# Altium footprint library nhan.PcbLib: 11 footprints
Each footprint in its own frame and in the unit in brackets; x right, y up, seen from the top. Pads: shape width x height; smd on the part's side, far side on the other; paste and mask are expansions set on the pad; w line width, h text height; cw(c..) or ccw(c..) is an arc to the next point about the centre after c.
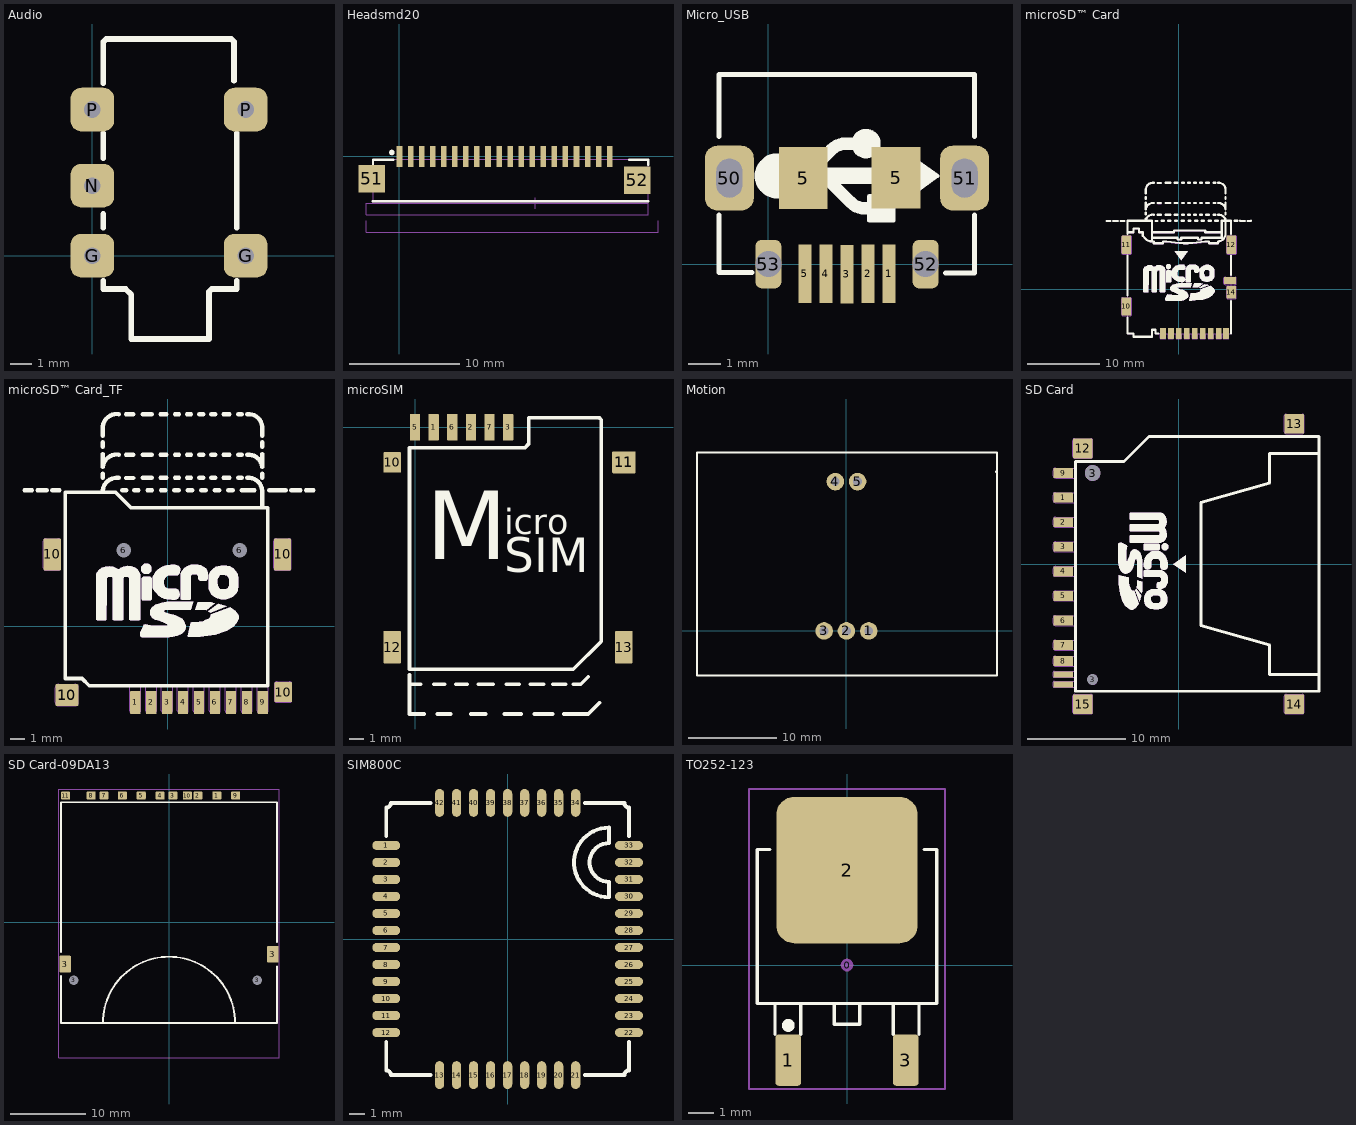
[diagram p0: the footprints below, top view; thin cyan lines are the x and y axes]

## Audio [mm]
pads (5):
  rrect50% 2x2 hole 0.762 square: G(0,0) G(7.01,0) N(0,3.2) P(0,6.68) P(7.01,6.68)
Top Overlay:
  lines w0.254: 0.508,-1.143 0.508,-1.524 1.524,-1.524 1.778,-1.778 1.778,-3.81 5.334,-3.81 5.334,-1.651 5.461,-1.524 6.604,-1.524 6.604,-1.143 ; 0.508,1.27 0.508,1.905 ; 0.508,4.445 0.508,5.588 ; 0.508,7.874 0.508,8.89 0.508,9.652 0.508,9.779 0.635,9.906 6.35,9.906 6.477,9.779 6.477,8.001 ; 6.604,1.27 6.604,5.588
3D body "User Library-minijack.STEP": height 5.01, standoff -1.99, extent 0.858,-3.952 6.858,10.048

## Headsmd20 [mm] "Headsmd20-1mmpich"
pads (22):
  rect 0.5x1.9 smd: 1(0,0) 2(1,0) 3(2,0) 4(3,0) 5(4,0) 6(5,0) 7(6,0) 8(7,0) 9(8,0) 10(9,0) 11(10,0) 12(11,0) 13(12,0) 14(13,0) 15(14,0) 16(15,0) 17(16,0) 18(17,0) 19(18,0) 20(19,0)
  rect 2.4x2.5 smd: 51(-2.5,-2.032) 52(21.5,-2.159)
Top Overlay:
  circle w0.25: c-0.692,0.35 r0.125
  lines w0.2: -2.413,-4.064 22.479,-4.064 ; -2.392,-1.1 -2.392,-0.3 -0.542,-0.3 ; 20.74,-0.3 22.479,-0.3 22.479,-0.762
Mechanical 13:
  lines w0.1: -2.992,-5.8 -2.992,-6.85 23.368,-6.85 23.368,-5.8 ; -2.992,-5.3 22.479,-5.3 22.479,-4.25 -2.992,-4.25 -2.992,-5.3 ; -2.392,-4.191 -2.392,-0.254 22.479,-0.254 22.479,-4.191 -2.392,-4.191
Mechanical 15:
  lines w0.1: 11.758,-4.25 12.758,-4.25 ; 12.258,-4.75 12.258,-3.75
3D body: height 2, standoff 0, extent -2.33,-3.568 22.479,0.381
3D body: height 2, standoff 0, extent -2.991,-5.299 22.479,-4.251

## Micro_USB [mm]
pads (11):
  rect 0.4x1.8 smd: 1(3.725,-0.3) 2(3.075,-0.3) 3(2.425,-0.311) 4(1.775,-0.3) 5(1.125,-0.3)
  rect 1.5x1.9 smd: 5(1.071,2.653) 5(3.937,2.667)
  rrect50% 1.5x2 hole 0.8 slot 1.2 at 90 deg: 50(-1.2,2.65) 51(6.05,2.65)
  rrect50% 0.8x1.5 hole 0.8: 52(4.85,0) 53(0,0)
Top Overlay:
  circle w0.508: c3.011,3.714 r0.2
  circle w0.889: c0.277,2.718 r0.254
  region: 3.862,1.343 3.111,1.343 3.111,2.093 3.862,2.093
  region: 5.212,2.718 4.512,2.218 4.512,3.218
  lines w0.127: 3.111,1.343 3.862,1.343 3.862,2.093 3.111,2.093 3.111,1.343 ; 4.512,2.218 4.512,3.218 5.212,2.718 4.512,2.218
  lines w0.152: -1.524,1.519 -1.524,-0.254 -0.508,-0.254 ; -1.524,3.933 -1.524,5.842 6.35,5.842 6.35,3.933 ; 5.461,-0.279 6.35,-0.279 6.35,1.519
  lines w0.381: 1.071,2.653 1.944,3.526 cw(c2.397,3.073) 2.397,3.714 2.984,3.714 ; 1.786,2.655 2.536,1.905 ccw(c2.988,2.358) 2.988,1.718 3.492,1.718
  lines w0.508: 0.318,2.718 4.763,2.718
3D body "User Library-ZX62D-AB-5P8.STEP": height 2.75, standoff -0.64, extent -2.039,-0.054 6.611,5.845

## microSD™ Card [mm] "CONN MICRO SD CARD PUSH-PUSH R/A"
height 1.7
pads (14):
  rrect10% 0.8x1.5 smd: 1(-2.21,-6.119) 2(-1.11,-6.119) 3(-0.01,-6.119) 4(1.09,-6.119) 5(2.19,-6.119) 6(3.29,-6.119) 7(4.39,-6.119)
  rrect10% 0.8x1.5 smd mask+0.1: 8(5.49,-6.119) 9(6.49,-6.119)
  rrect10% 1.3x2.5 smd: 10(-7.247,-2.381) 11(-7.247,6.119) 12(7.247,6.119)
  rrect10% 1.7x1 smd: 13(7.048,1.169)
  rrect10% 1.3x1.7 smd: 14(7.247,-0.431)
Top Overlay:
  drawing of 124 lines, arcs and shapes, not listed
Mechanical 1:
  drawing of 189 lines, arcs and shapes, not listed
  text "NC" at 6.921,-5.06 h0.8
  text "DAT1" at 5.905,-5.06 h0.8
  text "DAT0" at 4.763,-5.06 h0.8
  text "VSS" at 3.619,-5.06 h0.8
  text "CLK" at 2.603,-5.06 h0.8
  text "VDD" at 1.46,-5.06 h0.8
  text "CMD" at 0.445,-5.06 h0.8
  text "DAT3" at -0.699,-5.06 h0.8
  text "DAT2" at -1.742,-5.16 h0.8
3D body "Micro_SD.step": height 1.8, standoff 0.82, extent -4.548,-0.375 6.452,14.625
3D body "MEM2055-00-190-01-A_revG.step": height 1.85, standoff -0.6, extent -7.936,-5.832 8.063,9.418

## microSD™ Card_TF [mm] "Micro SD Socket SMT ATTEND 112J-TDAR-R01"
height 1.7
pads (15):
  rrect10% 0.7x1.6 smd: 1(-2.235,-5.25) 2(-1.135,-5.25) 3(-0.035,-5.25) 4(1.065,-5.25) 5(2.165,-5.25) 6(3.265,-5.25) 7(4.365,-5.25) 8(5.465,-5.25) 9(6.565,-5.25)
  round 0.762 hole 1 mask+0: 6(-3.035,5.25) 6(4.965,5.25)
  rrect10% 1.2x2.2 smd: 10(-7.976,4.961) 10(7.925,4.961)
  rrect10% 1.6x1.5 smd: 10(-6.96,-4.742)
  rrect10% 1.2x1.4 smd: 10(7.976,-4.539)
Top Overlay:
  drawing of 77 lines, arcs and shapes, not listed
Mechanical 1:
  drawing of 155 lines, arcs and shapes, not listed
3D body "User Library-Micro SD.STEP": height 2, standoff -0.47, extent -8.21,-5.931 8.096,9.279
3D body "Micro_SD.step": height 1.7, standoff 0.72, extent -4.547,-0.375 6.452,14.625

## microSIM [mm] "microSIM PUSH"
pads (10):
  rrect10% 0.7x1.8 smd: 1(1.27,0) 2(3.81,0) 3(6.35,0) 5(0,0) 6(2.54,0) 7(5.08,0)
  rrect10% 1.2x1.4 smd: 10(-1.56,-2.4)
  rrect10% 1.6x1.5 smd: 11(14.24,-2.4)
  rrect10% 1.2x2.2 smd: 12(-1.56,-15) 13(14.24,-15)
Top Overlay:
  lines w0.254: -0.381,-16.891 -0.381,-17.526 ; 0,-19.558 0.635,-19.558 -0.381,-19.558 -0.381,-17.526 ; 0.381,-17.526 -0.381,-17.526 ; 1.27,-17.526 2.032,-17.526 ; 1.524,-19.558 2.413,-19.558 ; 2.794,-17.526 3.556,-17.526 ; 3.81,-19.558 4.826,-19.558 ; 4.318,-17.526 5.334,-17.526 ; 6.096,-19.558 7.239,-19.558 ; 6.223,-17.526 7.112,-17.526 ; 7.874,-17.526 8.763,-17.526 ; 8.128,-19.558 9.398,-19.558 ; 9.398,-17.526 10.287,-17.526 ; 10.16,-19.558 11.176,-19.558 11.811,-19.558 12.573,-18.796 ; 10.795,-17.526 11.303,-17.526 11.811,-17.018 ; 12.573,-14.732 12.7,-14.605 ; 12.7,-14.605 12.7,-1.397 12.7,0.508 12.573,0.635 7.747,0.635 7.747,-1.143 7.493,-1.397 -0.381,-1.397 -0.381,-16.51 10.795,-16.51 12.7,-14.605
  text "SIM" at 6.096,-10.668 h4
  text "icro" at 6.096,-7.874 h3
  text "M" at 0.762,-10.541 h8
3D body "User Library-MicroSIM.STEP": height 1.26, standoff 0.01, extent -0.939,-16.451 13.461,-0.451

## Motion [mm]
pads (5):
  round 2 hole 1: 1(2.54,0) 2(0,0) 3(-2.54,0) 4(-1.27,17) 5(1.27,17)
Top Overlay:
  lines w0.254: -17.018,20.193 -17.018,-5.08 1.143,-5.08 ; -17.018,20.32 1.778,20.32 ; 0,-5.08 17.145,-5.08 17.145,18.034 17.018,18.161 ; 1.27,20.32 17.145,20.32 17.145,17.399

## SD Card [mm] "SD (Secure Digital) Card Connector, SMD, Right Angle"
height 1.7
pads (17):
  rrect10% 2x1 smd: 1(-11.75,6.75) 2(-11.75,4.25) 3(-11.75,1.75) 4(-11.75,-0.75) 5(-11.75,-3.25) 6(-11.75,-5.75) 7(-11.75,-8.25) 8(-11.75,-9.875) 9(-11.75,9.25)
  round 1 hole 1.1 mask+0: 3(-8.75,-11.75)
  round 1.5 hole 1.6 mask+0: 3(-8.75,9.25)
  rrect10% 2x0.6 smd: 10(-11.75,-11.25) 11(-11.75,-12.25)
  rrect10% 2x2 smd: 12(-9.75,11.75) 13(11.75,14.25) 14(11.75,-14.25) 15(-9.75,-14.25)
Top Overlay:
  drawing of 37 lines, arcs and shapes, not listed
Mechanical 1:
  drawing of 113 lines, arcs and shapes, not listed
  text "9" at -10.15,8.85 h0.8
  text "11" at -10.25,-12.65 h0.8
  text "10" at -10.25,-11.35 h0.8
  text "8" at -10.15,-10.25 h0.8
  text "1" at -10.05,6.35 h0.8
3D body "User Library-2041021-4.step": height 3.32, standoff -0.58, extent -11.953,-14.103 14.297,13.872
3D body "SD card.step": height 2.32, standoff 0.22, extent -6.668,-11.981 25.332,12.019

## SD Card-09DA13 [mil] "Socket A SD-09-D-A-1-3"
height 66.93
pads (15):
  rrect20% 47.24x40 smd: 1(249.02,661) 2(150.59,661) 3(20.67,661) 4(-46.26,661) 5(-144.69,661) 6(-243.11,661) 7(-338.58,661) 8(-405.51,661) 9(347.44,661) 10(95.47,661) 11(-538.58,661)
  rrect20% 60x88 smd: 3(-541,-217) 3(541,-166)
  round 40 hole 50 mask+0: 3(-496,-301) 3(460,-302)
Top Overlay:
  lines w10: -562.2,-280 -562.2,-524 562.2,-524 562.2,-229 ; -562.2,-154 -562.2,626 562.2,626 562.2,-103 ; -344.49,-522.5 cw(c0,-523.5) 344.49,-522.5
Mechanical 1:
  lines w1.97: -562.2,-280 -562.2,-524 562.2,-524 562.2,-229 ; -562.2,-154 -562.2,626 562.2,626 562.2,-103 ; -344.49,-522.5 cw(c0,-523.5) 344.49,-522.5
Mechanical 15:
  lines w2: -575,-705 -575,695 575,695 575,-705 -575,-705
3D body "User Library-SD Card-1.STEP": height 85.59, standoff 34.41, extent -477.44,-794.19 467.44,465.65
3D body "User Library-socket_a-sd-09-d-a-1-3.STEP": height 104.33, standoff -27.56, extent -571.93,-522.41 561.93,670.5

## SIM800C [mm]
pads (42):
  oval 1.8x0.6 smd: 1(-7.85,6.05) 2(-7.85,4.95) 3(-7.85,3.85) 4(-7.85,2.75) 5(-7.85,1.65) 6(-7.85,0.55) 7(-7.85,-0.55) 8(-7.85,-1.65) 9(-7.85,-2.75) 10(-7.85,-3.85) 11(-7.85,-4.95) 12(-7.85,-6.05) 22(7.85,-6.05) 23(7.85,-4.95) 24(7.85,-3.85) 25(7.85,-2.75) 26(7.85,-1.65) 27(7.85,-0.55) 28(7.85,0.55) 29(7.85,1.65) 30(7.85,2.75) 31(7.85,3.85) 32(7.85,4.95) 33(7.85,6.05)
  oval 0.6x1.8 smd: 13(-4.4,-8.8) 14(-3.3,-8.8) 15(-2.2,-8.8) 16(-1.1,-8.8) 17(0,-8.8) 18(1.1,-8.8) 19(2.2,-8.8) 20(3.3,-8.8) 21(4.4,-8.8) 34(4.4,8.8) 35(3.3,8.8) 36(2.2,8.8) 37(1.1,8.8) 38(0,8.8) 39(-1.1,8.8) 40(-2.2,8.8) 41(-3.3,8.8) 42(-4.4,8.8)
Top Overlay:
  lines w0.254: -7.85,-6.65 -7.85,-8.5 cw(c-7.85,-8.8) -7.55,-8.8 -5,-8.8 ; -7.85,6.65 -7.85,8.5 ccw(c-7.85,8.8) -7.55,8.8 -5,8.8 ; 5,-8.8 7.55,-8.8 cw(c7.85,-8.8) 7.85,-8.5 7.85,-6.65 ; 5,8.8 7.55,8.8 ccw(c7.85,8.8) 7.85,8.5 7.85,6.65 ; 6.55,2.7 cw(c6.55,4.95) 6.55,7.2 6.55,6.2 ccw(c6.55,4.95) 6.55,3.7 6.55,2.7
3D body "User Library-SIM800C-1.STEP": height 2.37, standoff 0.03, extent -7.85,-8.8 7.85,8.8

## TO252-123 [mm]
pads (4):
  round 0.5 on Mech15: 0(0,0)
  rrect25% 1x2 smd: 1(-2.285,-3.7) 3(2.285,-3.7)
  rrect25% 5.5x5.7 smd: 2(0,3.7)
Top Overlay:
  circle w0.25: c-2.285,-2.35 r0.125
  lines w0.127: -3,4.5 -3.5,4.5 -3.5,-1.5 3.5,-1.5 3.5,4.5 3,4.5 ; -2.8,-2.7 -2.8,-1.5 -1.8,-1.5 -1.8,-2.7 ; 1.8,-2.7 1.8,-1.5 2.8,-1.5 2.8,-2.7 ; -0.5,-2.3 0.5,-2.3 0.5,-1.5 -0.5,-1.5 -0.5,-2.3
Mechanical 15:
  lines w0.076: -3.81,-4.826 3.81,-4.826 3.81,6.858 -3.81,6.858 -3.81,-4.826
3D body "DPAK.stp": height 2.31, standoff 0, extent -3.3,-3.951 3.3,5.762